# Altium footprint library ZLS_Lib.PcbLib: 157 footprints (part 2 of 10)
Each footprint in its own frame and in the unit in brackets; x right, y up, seen from the top. Pads: shape width x height; smd on the part's side, far side on the other; paste and mask are expansions set on the pad; w line width, h text height; cw(c..) or ccw(c..) is an arc to the next point about the centre after c.
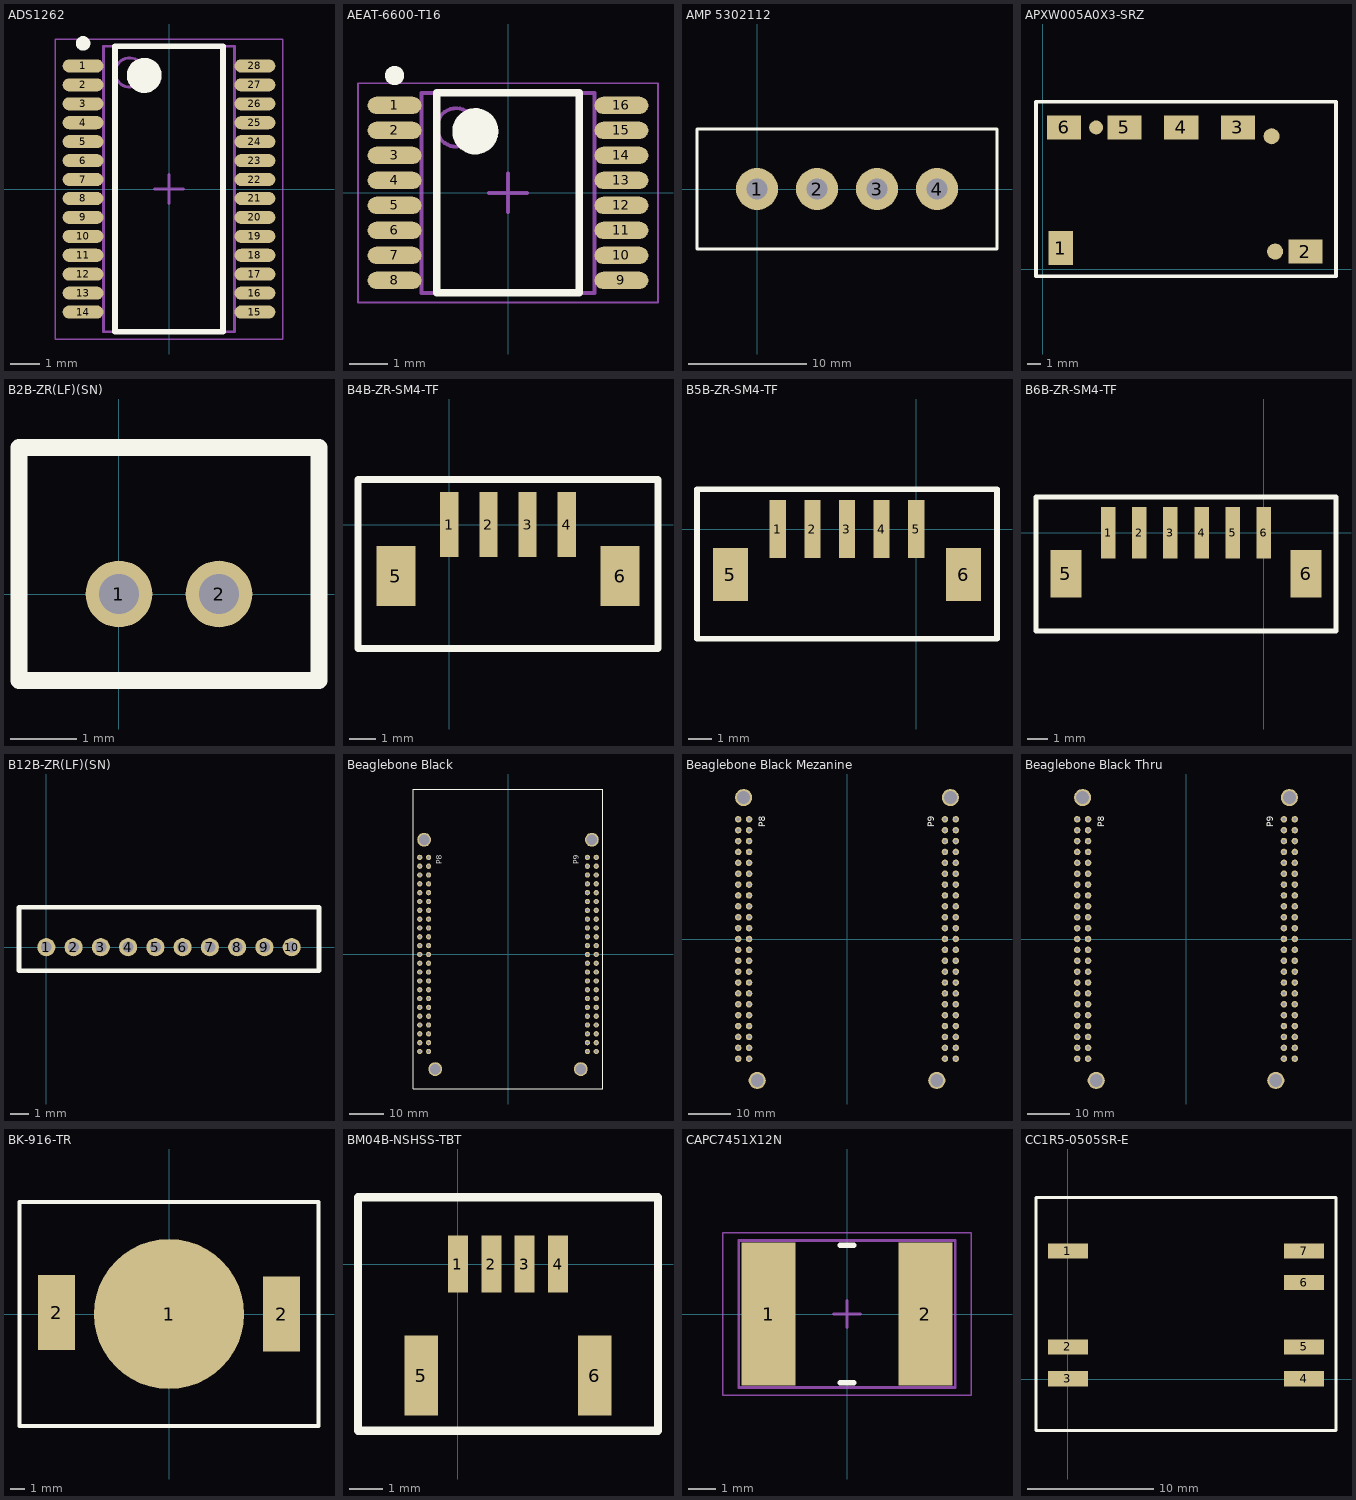
[diagram p1: the footprints below, top view; thin cyan lines are the x and y axes]

## ADS1262 [mm] "28 TSSOP"
height 1.2
pads (28):
  oval 1.4x0.45 smd: 1(-2.95,4.225) 2(-2.95,3.575) 3(-2.95,2.925) 4(-2.95,2.275) 5(-2.95,1.625) 6(-2.95,0.975) 7(-2.95,0.325) 8(-2.95,-0.325) 9(-2.95,-0.975) 10(-2.95,-1.625) 11(-2.95,-2.275) 12(-2.95,-2.925) 13(-2.95,-3.575) 14(-2.95,-4.225) 15(2.95,-4.225) 16(2.95,-3.575) 17(2.95,-2.925) 18(2.95,-2.275) 19(2.95,-1.625) 20(2.95,-0.975) 21(2.95,-0.325) 22(2.95,0.325) 23(2.95,0.975) 24(2.95,1.625) 25(2.95,2.275) 26(2.95,2.925) 27(2.95,3.575) 28(2.95,4.225)
Top Overlay:
  circle w0.25: c-2.95,5 r0.125
  circle w0.6: c-0.85,3.9 r0.3
  lines w0.2: -1.85,-4.9 -1.85,4.9 1.85,4.9 1.85,-4.9 -1.85,-4.9
Mechanical 13:
  circle w0.1: c-1.35,4 r0.5
  lines w0.1: -2.25,-4.9 -2.25,4.9 2.25,4.9 2.25,-4.9 -2.25,-4.9
Mechanical 15:
  lines w0.05: -3.9,-5.15 -3.9,5.15 3.9,5.15 3.9,-5.15 -3.9,-5.15
  lines w0.1: -0.5,0 0.5,0 ; 0,-0.5 0,0.5
3D body "ADS1262.step": height 1.2, standoff 0, extent -3.2,-4.9 3.2,4.9

## AEAT-6600-T16 [mm]
height 1.2
pads (16):
  oval 1.4x0.45 smd: 1(-2.95,2.275) 2(-2.95,1.625) 3(-2.95,0.975) 4(-2.95,0.325) 5(-2.95,-0.325) 6(-2.95,-0.975) 7(-2.95,-1.625) 8(-2.95,-2.275) 9(2.95,-2.275) 10(2.95,-1.625) 11(2.95,-0.975) 12(2.95,-0.325) 13(2.95,0.325) 14(2.95,0.975) 15(2.95,1.625) 16(2.95,2.275)
Top Overlay:
  circle w0.6: c-0.85,1.6 r0.3
  circle w0.25: c-2.95,3.05 r0.125
  lines w0.2: -1.85,-2.6 1.85,-2.6 1.85,2.6 -1.85,2.6 -1.85,-2.6
Mechanical 13:
  circle w0.1: c-1.35,1.7 r0.5
  lines w0.1: -2.25,-2.6 2.25,-2.6 2.25,2.6 -2.25,2.6 -2.25,-2.6
Mechanical 15:
  lines w0.05: -3.9,-2.85 3.9,-2.85 3.9,2.85 -3.9,2.85 -3.9,-2.85
  lines w0.1: -0.5,0 0.5,0 ; 0,-0.5 0,0.5
3D body "SOP127P600-8N.step": height 1.2, standoff 0, extent -3.2,-2.6 3.2,2.6

## AMP 5302112 [mil] "4 Pin Mate-N-Loc Connector"
height 375
pads (4):
  round 140 hole 70: 1(0,0) 2(200,0) 3(400,0) 4(600,0)
Top Overlay:
  lines w10: -200,-200 -200,200 800,200 800,-200 -200,-200

## APXW005A0X3-SRZ [mm] "DC/DC CONVERTER 3-18V 45W"
pads (9):
  rect 1.73x2.44 smd: 1(1.27,1.52)
  rect 2.44x1.73 smd: 2(18.8,1.27) 3(13.97,10.16) 4(9.91,10.16) 5(5.84,10.16) 6(1.52,10.16)
  round 1 smd: ""(3.81,10.16)
  round 1.15 smd: ""(16.38,9.53) ""(16.64,1.27)
Top Overlay:
  lines w0.254: -0.5,-0.5 -0.5,12 21,12 21,-0.5 -0.5,-0.5
3D body: height 3, standoff 2, extent 19,0.75 20.5,4.25
3D body: height 3, standoff 2, extent 6.25,9.25 9.75,10.75
3D body: height 3, standoff 2, extent 1.25,9.25 4.75,10.75
3D body: height 2, standoff 0, extent 0,0 21,12
3D body: height 6, standoff 0, extent 2,2 19,9

## B2B-ZR(LF)(SN) [mm]
height 4.5
pads (2):
  round 1 hole 0.6: 1(0,0) 2(1.5,0)
Top Overlay:
  lines w0.254: -1.5,-1.3 -1.5,-0.5 -1.5,2.2 3,2.2 3,-1.3 -1.5,-1.3

## B4B-ZR-SM4-TF [mm]
height 6
pads (6):
  rect 0.7x2.5 smd: 1(0,0) 2(1.5,0) 3(3,0) 4(4.5,0)
  rect 1.5x2.3 smd: 5(-2.05,-1.975) 6(6.55,-1.975)
Top Overlay:
  lines w0.254: -3.5,-4.75 8,-4.75 8,1.725 -3.5,1.725 -3.5,-4.75
3D body "B4B-ZR-SM4-TF.STEP": height 5, standoff 0, extent -2.25,-4 6.75,1.2

## B5B-ZR-SM4-TF [mm]
pads (7):
  rect 0.7x2.5 smd: 1(-6,0) 2(-4.5,0) 3(-3,0) 4(-1.5,0) 5(0,0)
  rect 1.5x2.3 smd: 5(-8.05,-1.975) 6(2.05,-1.975)
Top Overlay:
  lines w0.254: -9.5,-4.75 3.5,-4.75 3.5,1.725 -9.5,1.725 -9.5,-4.75
3D body "B5B-ZR-SM4-TF.STEP": height 5, standoff 0, extent -8.25,-4 2.25,1.2

## B6B-ZR-SM4-TF [mm]
pads (8):
  rect 0.7x2.5 smd: 1(-7.5,0) 2(-6,0) 3(-4.5,0) 4(-3,0) 5(-1.5,0) 6(0,0)
  rect 1.5x2.3 smd: 5(-9.55,-1.975) 6(2.05,-1.975)
Top Overlay:
  lines w0.254: -11,-4.75 3.5,-4.75 3.5,1.725 -11,1.725 -11,-4.75
3D body "B6B-ZR-SM4-TF.STEP": height 5, standoff 0, extent -9.75,-4 2.25,1.2

## B12B-ZR(LF)(SN) [mm]
height 4.5
pads (10):
  round 1 hole 0.6: 1(0,0) 2(1.5,0) 3(3,0) 4(4.5,0) 5(6,0) 6(7.5,0) 7(9,0) 8(10.5,0) 9(12,0) 10(13.5,0)
Top Overlay:
  lines w0.254: -1.5,-1.3 15,-1.3 15,2.2 -1.5,2.2 -1.5,-0.5 -1.5,-1.3

## Beaglebone Black [mil]
pads (96):
  round 60 hole 31.5: 8-1(-900,1100) 8-3(-900,1000) 8-4(-1000,1000) 8-5(-900,900) 8-6(-1000,900) 8-7(-900,800) 8-8(-1000,800) 8-9(-900,700) 8-10(-1000,700) 8-11(-900,600) 8-12(-1000,600) 8-13(-900,500) 8-14(-1000,500) 8-15(-900,400) 8-16(-1000,400) 8-17(-900,300) 8-18(-1000,300) 8-19(-900,200) 8-20(-1000,200) 8-21(-900,100) 8-22(-1000,100) 8-23(-900,0) 8-24(-1000,0) 8-25(-900,-100) 8-26(-1000,-100) 8-27(-900,-200) 8-28(-1000,-200) 8-29(-900,-300) 8-30(-1000,-300) 8-31(-900,-400) 8-32(-1000,-400) 8-33(-900,-500) 8-34(-1000,-500) 8-35(-900,-600) 8-36(-1000,-600) 8-37(-900,-700) 8-38(-1000,-700) 8-39(-900,-800) 8-40(-1000,-800) 8-41(-900,-900) 8-42(-1000,-900) 8-43(-900,-1000) 8-44(-1000,-1000) 8-45(-900,-1100) 8-46(-1000,-1100) 9-1(1000,1100) 9-2(900,1100) 9-3(1000,1000) 9-4(900,1000) 9-5(1000,900) 9-6(900,900) 9-7(1000,800) 9-8(900,800) 9-9(1000,700) 9-10(900,700) 9-11(1000,600) 9-12(900,600) 9-13(1000,500) 9-14(900,500) 9-15(1000,400) 9-16(900,400) 9-17(1000,300) 9-18(900,300) 9-19(1000,200) 9-20(900,200) 9-21(1000,100) 9-22(900,100) 9-23(1000,0) 9-24(900,0) 9-25(1000,-100) 9-26(900,-100) 9-27(1000,-200) 9-28(900,-200) 9-29(1000,-300) 9-30(900,-300) 9-31(1000,-400) 9-32(900,-400) 9-33(1000,-500) 9-34(900,-500) 9-35(1000,-600) 9-36(900,-600) 9-37(1000,-700) 9-38(900,-700) 9-39(1000,-800) 9-40(900,-800) 9-41(1000,-900) 9-42(900,-900) 9-43(1000,-1000) 9-44(900,-1000) 9-45(1000,-1100) 9-46(900,-1100)
  round 60 hole 30 paste+0: 8-2(-1000,1100)
  round 157.48 hole 118.11 paste+0: ""(-950,1300)
  round 157.48 hole 118.11: ""(-825,-1300) ""(825,-1300) ""(950,1300)
Top Overlay:
  lines w10: -1075,-1525 -1075,1875 1075,1875 1075,-1525 -1075,-1525
  text "P8" at -750,1025 h60
  text "P9" at 800,1025 h60
3D body "BEAGLEBONE_BLACK - NO LAN PORT.SLDPRT": height 493.04, standoff 146.06, extent -1077.76,-1586.02 1074.2,1975
3D body "_SSW_123_01_G_D_terminal_2.sldprt": height 335, standoff 0, extent -1047.5,-1163 -852.5,1157
3D body "_SSW_123_01_G_D_terminal_2.sldprt": height 335, standoff 0, extent 852.5,-1163 1047.5,1157

## Beaglebone Black Mezanine [mil]
pads (96):
  round 60 hole 31.5: 8-1(-900,1100) 8-3(-900,1000) 8-4(-1000,1000) 8-5(-900,900) 8-6(-1000,900) 8-7(-900,800) 8-8(-1000,800) 8-9(-900,700) 8-10(-1000,700) 8-11(-900,600) 8-12(-1000,600) 8-13(-900,500) 8-14(-1000,500) 8-15(-900,400) 8-16(-1000,400) 8-17(-900,300) 8-18(-1000,300) 8-19(-900,200) 8-20(-1000,200) 8-21(-900,100) 8-22(-1000,100) 8-23(-900,0) 8-24(-1000,0) 8-25(-900,-100) 8-26(-1000,-100) 8-27(-900,-200) 8-28(-1000,-200) 8-29(-900,-300) 8-30(-1000,-300) 8-31(-900,-400) 8-32(-1000,-400) 8-33(-900,-500) 8-34(-1000,-500) 8-35(-900,-600) 8-36(-1000,-600) 8-37(-900,-700) 8-38(-1000,-700) 8-39(-900,-800) 8-40(-1000,-800) 8-41(-900,-900) 8-42(-1000,-900) 8-43(-900,-1000) 8-44(-1000,-1000) 8-45(-900,-1100) 8-46(-1000,-1100) 9-1(1000,1100) 9-2(900,1100) 9-3(1000,1000) 9-4(900,1000) 9-5(1000,900) 9-6(900,900) 9-7(1000,800) 9-8(900,800) 9-9(1000,700) 9-10(900,700) 9-11(1000,600) 9-12(900,600) 9-13(1000,500) 9-14(900,500) 9-15(1000,400) 9-16(900,400) 9-17(1000,300) 9-18(900,300) 9-19(1000,200) 9-20(900,200) 9-21(1000,100) 9-22(900,100) 9-23(1000,0) 9-24(900,0) 9-25(1000,-100) 9-26(900,-100) 9-27(1000,-200) 9-28(900,-200) 9-29(1000,-300) 9-30(900,-300) 9-31(1000,-400) 9-32(900,-400) 9-33(1000,-500) 9-34(900,-500) 9-35(1000,-600) 9-36(900,-600) 9-37(1000,-700) 9-38(900,-700) 9-39(1000,-800) 9-40(900,-800) 9-41(1000,-900) 9-42(900,-900) 9-43(1000,-1000) 9-44(900,-1000) 9-45(1000,-1100) 9-46(900,-1100)
  round 60 hole 30 paste+0: 8-2(-1000,1100)
  round 157.48 hole 118.11 paste+0: ""(-950,1300)
  round 157.48 hole 118.11: ""(-825,-1300) ""(825,-1300) ""(950,1300)
Top Overlay:
  text "P8" at -750,1025 h60
  text "P9" at 800,1025 h60
3D body "_SSW_123_01_G_D_terminal_2.sldprt": height 335, standoff 0, extent -1047.5,-1163 -852.5,1157
3D body "_SSW_123_01_G_D_terminal_2.sldprt": height 335, standoff 0, extent 852.5,-1163 1047.5,1157

## Beaglebone Black Thru [mil]
pads (96):
  round 60 hole 31.5: 8-1(-900,1100) 8-3(-900,1000) 8-4(-1000,1000) 8-5(-900,900) 8-6(-1000,900) 8-7(-900,800) 8-8(-1000,800) 8-9(-900,700) 8-10(-1000,700) 8-11(-900,600) 8-12(-1000,600) 8-13(-900,500) 8-14(-1000,500) 8-15(-900,400) 8-16(-1000,400) 8-17(-900,300) 8-18(-1000,300) 8-19(-900,200) 8-20(-1000,200) 8-21(-900,100) 8-22(-1000,100) 8-23(-900,0) 8-24(-1000,0) 8-25(-900,-100) 8-26(-1000,-100) 8-27(-900,-200) 8-28(-1000,-200) 8-29(-900,-300) 8-30(-1000,-300) 8-31(-900,-400) 8-32(-1000,-400) 8-33(-900,-500) 8-34(-1000,-500) 8-35(-900,-600) 8-36(-1000,-600) 8-37(-900,-700) 8-38(-1000,-700) 8-39(-900,-800) 8-40(-1000,-800) 8-41(-900,-900) 8-42(-1000,-900) 8-43(-900,-1000) 8-44(-1000,-1000) 8-45(-900,-1100) 8-46(-1000,-1100) 9-1(1000,1100) 9-2(900,1100) 9-3(1000,1000) 9-4(900,1000) 9-5(1000,900) 9-6(900,900) 9-7(1000,800) 9-8(900,800) 9-9(1000,700) 9-10(900,700) 9-11(1000,600) 9-12(900,600) 9-13(1000,500) 9-14(900,500) 9-15(1000,400) 9-16(900,400) 9-17(1000,300) 9-18(900,300) 9-19(1000,200) 9-20(900,200) 9-21(1000,100) 9-22(900,100) 9-23(1000,0) 9-24(900,0) 9-25(1000,-100) 9-26(900,-100) 9-27(1000,-200) 9-28(900,-200) 9-29(1000,-300) 9-30(900,-300) 9-31(1000,-400) 9-32(900,-400) 9-33(1000,-500) 9-34(900,-500) 9-35(1000,-600) 9-36(900,-600) 9-37(1000,-700) 9-38(900,-700) 9-39(1000,-800) 9-40(900,-800) 9-41(1000,-900) 9-42(900,-900) 9-43(1000,-1000) 9-44(900,-1000) 9-45(1000,-1100) 9-46(900,-1100)
  round 60 hole 30 paste+0: 8-2(-1000,1100)
  round 157.48 hole 118.11 paste+0: ""(-950,1300)
  round 157.48 hole 118.11: ""(-825,-1300) ""(825,-1300) ""(950,1300)
Top Overlay:
  text "P8" at -750,1025 h60
  text "P9" at 800,1025 h60
3D body "_T1SSW_123_23_G_D_2.sldprt": height -39.37, standoff -374.37, extent 852.5,-1163 1047.5,1157
3D body "_T1SSW_123_23_G_D_2.sldprt": height -39.37, standoff -374.37, extent -1047.5,-1159.99 -852.5,1160.01
3D body "_P2SSW_123_23_G_D_4.sldprt": height 119.04, standoff -314.96, extent -1024,-1120.49 -876,1120.5
3D body "_P2SSW_123_23_G_D_4.sldprt": height 314.96, standoff -119.04, extent 876,-1123.5 1024,1117.5

## BK-916-TR [mm]
height 3.6
pads (3):
  round 10.2 smd: 1(0,0)
  rect 2.5x5.1 smd: 2(-7.65,0.1) 2(7.65,0)
Top Overlay:
  lines w0.254: -10.16,-7.62 10.16,-7.62 10.16,7.62 -10.16,7.62 -10.16,-7.62
3D body: height 4.44, standoff 0, extent -10.1,-7.65 10.175,7.578

## BM04B-NSHSS-TBT [mm]
height 7.8
pads (6):
  rect 0.6x1.7 smd: 1(0,0) 2(1,0) 3(2,0) 4(3,0)
  rect 1x2.4 smd: 5(-1.1,-3.35) 6(4.1,-3.35)
Top Overlay:
  lines w0.254: -3,-5 6,-5 6,2 -3,2 -3,-5
3D body "BM04B-NSHSS-TBT.STEP": height 1.95, standoff -4.2, extent -1.775,-4.475 4.225,0.475

## CAPC7451X12N [mm] "Chip Capacitor, 2-Leads, Body 7.36x5.12mm, IPC Medium Density"
height 1.25
pads (2):
  rect 2x5.3 smd: 1(-2.9,0) 2(2.9,0)
Top Overlay:
  lines w0.2: -0.25,-2.55 0.25,-2.55 ; -0.25,2.55 0.25,2.55
Mechanical 13:
  lines w0.1: -4,-2.72 -4,2.72 ; -3.99,-2.72 3.99,-2.72 ; -3.99,2.72 3.99,2.72 ; 4,-2.72 4,2.72
Mechanical 15:
  lines w0.05: -4.6,-3 -4.6,3 4.6,3 4.6,-3 -4.6,-3
  lines w0.1: -0.5,0 0.5,0 ; 0,-0.5 0,0.5
3D body "CAPC7451X12N.step": height 1.25, standoff 0, extent -3.99,-2.72 3.99,2.72

## CC1R5-0505SR-E [mm] "DC-DC Converter"
height 8.8
pads (7):
  rect 3.2x1.2 smd: 1(0,10.211) 2(0,2.591) 3(0,0.051) 4(18.8,0.051) 5(18.8,2.591) 6(18.8,7.711) 7(18.8,10.211)
Top Overlay:
  lines w0.254: -2.54,-4.064 -2.54,14.478 21.336,14.478 21.336,-4.064 -2.54,-4.064
3D body: height 8.8, standoff 0, extent -1.702,-0.651 20.502,10.912
3D body: height 8.8, standoff 0, extent -1.702,-3.327 20.502,13.558
3D body: height 8.8, standoff 0, extent -0.001,-3.201 18.822,13.431